# Altium footprint library Misc.PcbLib: 159 footprints (part 6 of 10)
Each footprint in its own frame and in the unit in brackets; x right, y up, seen from the top. Pads: shape width x height; smd on the part's side, far side on the other; paste and mask are expansions set on the pad; w line width, h text height; cw(c..) or ccw(c..) is an arc to the next point about the centre after c.
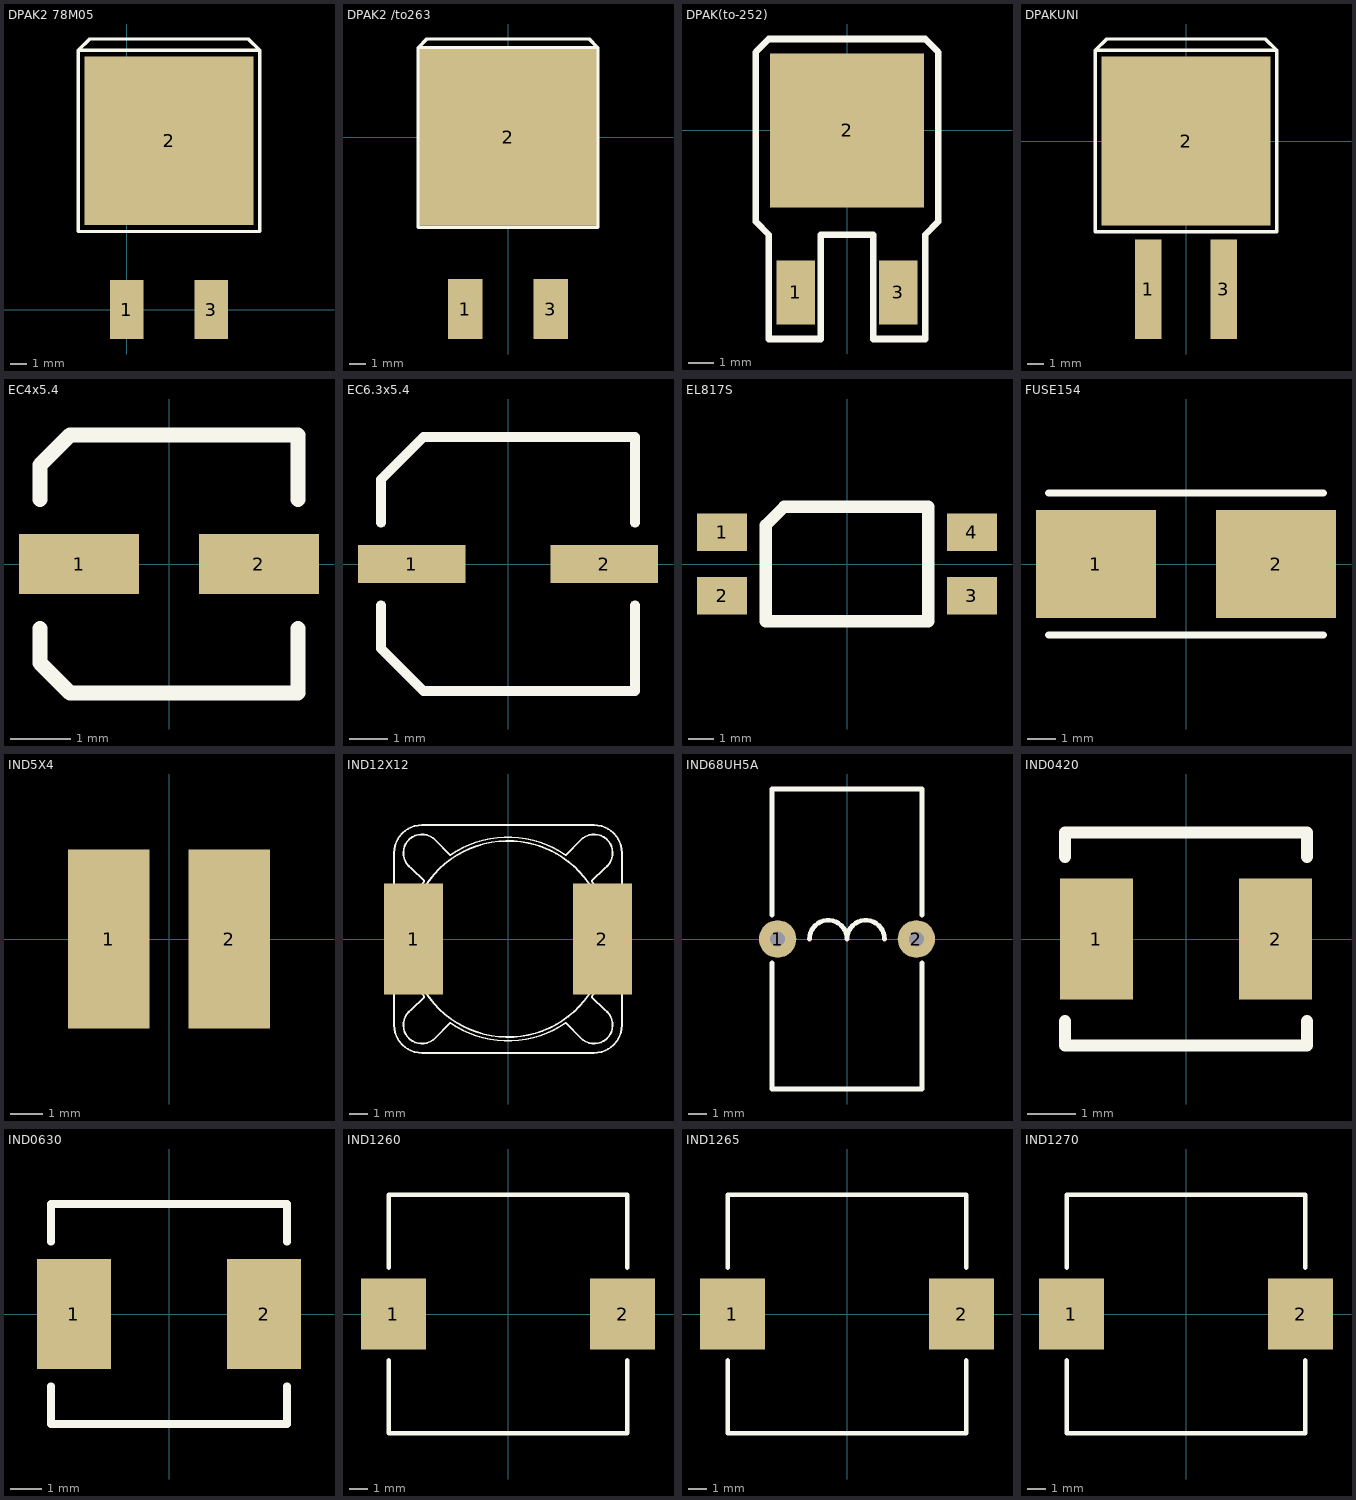
[diagram p5: the footprints below, top view; thin cyan lines are the x and y axes]

## DPAK2 78M05 [mil]
pads (3):
  rect 80x140 smd: 1(0,0) 3(200,0)
  rect 400x400 smd: 2(100,400)
Top Overlay:
  lines w8: -115,615 -88,642 288,642 315,615 ; -115,615 315,615 ; -115,615 -115,185 315,185 315,615
3D body "SW3dPS-DPAK.STEP": height 192.32, standoff -5.24, extent -110,-30.71 290,570.22

## DPAK2 /to263 [mm]
pads (3):
  rect 2.032x3.556 smd: 1(-2.54,-10.2) 3(2.54,-10.2)
  rect 10.49x10.5 smd: 2(0,0)
Top Overlay:
  lines w0.203: -5.334,5.334 -4.826,5.842 4.826,5.842 5.334,5.334 ; -5.334,5.334 -5.334,-5.334 5.334,-5.334 5.334,5.334 ; -5.334,5.334 5.334,5.334

## DPAK(to-252) [mm]
pads (3):
  rect 1.5x2.5 smd: 1(-2,-6.312) 3(2,-6.312)
  rect 6x6 smd: 2(0,0)
Top Overlay:
  lines w0.254: -3.556,-3.556 -3.556,3.048 -3.048,3.556 3.048,3.556 3.556,3.048 3.556,-3.556 3.048,-4.064 3.048,-8.128 1.016,-8.128 1.016,-4.064 -1.016,-4.064 -1.016,-8.128 -3.048,-8.128 -3.048,-4.064 -3.556,-3.556

## DPAKUNI [mm]
pads (3):
  rect 1.6x6 smd: 1(-2.28,-8.93) 3(2.28,-8.93)
  rect 10.16x10.16 smd: 2(0,0)
Top Overlay:
  lines w0.203: -5.461,5.461 -5.461,-5.461 5.461,-5.461 5.461,5.461 ; -5.461,5.461 5.461,5.461 ; -5.461,5.461 -4.775,6.147 4.775,6.147 5.461,5.461
3D body "SW3dPS-DPAK.STEP": height 4.88, standoff -0.13, extent -5.08,-11.188 5.08,4.076

## EC4x5.4 [mm]
height 5.4
pads (2):
  rect 2x1 smd: 1(-1.5,0) 2(1.5,0)
Top Overlay:
  lines w0.254: -2.15,-1.075 -2.15,-1.65 -1.65,-2.15 2.15,-2.15 2.15,-1.075 ; -2.15,1.075 -2.15,1.65 -1.65,2.15 2.15,2.15 2.15,1.075

## EC6.3x5.4 [mm]
height 5.4
pads (2):
  rect 2.8x1 smd: 1(-2.5,0) 2(2.5,0)
Top Overlay:
  lines w0.254: -3.3,-1.075 -3.3,-2.2 -2.2,-3.3 3.3,-3.3 3.3,-1.075 ; -3.3,1.075 -3.3,2.2 -2.2,3.3 3.3,3.3 3.3,1.075

## EL817S [mm]
height 4.3
pads (4):
  rect 2x1.5 smd: 1(-5,1.27) 2(-5,-1.27) 3(5,-1.27) 4(5,1.27)
Top Overlay:
  lines w0.5: -3.25,-2.29 3.25,-2.29 3.25,2.29 -2.51,2.29 -3.25,1.55 -3.25,-2.29
3D body: height 4.3, standoff 0.8, extent -3.25,-2.29 3.25,2.29

## FUSE154 [mm]
height 3.81
pads (2):
  rect 4.24x3.81 smd: 1(-3.185,0) 2(3.185,0)
Top Overlay:
  lines w0.254: -4.865,-2.515 4.865,-2.515 ; -4.865,2.515 4.865,2.515
3D body: height 3.81, standoff 0, extent -4.865,-2.515 4.865,2.515

## IND5X4 [mm]
height 4.5
pads (2):
  rect 2.5x5.5 smd: 1(-1.85,0) 2(1.85,0)
3D body "µç¸Ð.STEP": height 4.5, standoff -0.01, extent -2.857,-2.6 2.857,2.6

## IND12X12 [mm]
pads (2):
  rect 3.2x6 smd: 1(-5.1,0) 2(5.1,0)
Top Overlay:
  circle w0.1: c0,0 r5.3
  lines w0.1: -3.118,-4.533 -3.943,-5.357 cw(c-4.65,-4.65) -5.224,-3.831 -4.532,-3.139 -4.532,-3.117 cw(c0,0) -4.531,3.117 -4.531,3.138 -5.224,3.831 cw(c-4.65,4.65) -3.943,5.357 -3.118,4.533 ; -3.117,-4.531 ccw(c0,0) 3.117,-4.532 3.943,-5.357 ccw(c4.65,-4.65) 5.224,-3.831 4.532,-3.139 4.532,-3.117 ccw(c0,0) 4.531,3.117 4.531,3.138 5.224,3.831 ccw(c4.65,4.65) 3.943,5.357 3.117,4.531 ccw(c0,0) -3.117,4.531 ; -6.15,-4.65 ccw(c-4.65,-4.65) -4.65,-6.15 4.65,-6.15 ccw(c4.65,-4.65) 6.15,-4.65 6.15,4.65 ccw(c4.65,4.65) 4.65,6.15 -4.65,6.15 ccw(c-4.65,4.65) -6.15,4.65 -6.15,-4.65
3D body "User Library-CDRH124_Sumida.step": height 4.6, standoff 0.05, extent -6.15,-6.15 6.15,6.15

## IND68UH5A [mm] "Wire 0.75mm, Core 13mm 50125, Total diameter 15.5mm"
height 16
pads (2):
  round 2 hole 0.8: 1(-3.7,0) 2(3.7,0)
Top Overlay:
  lines w0.254: -4,-1.27 -4,-8 4,-8 4,-1.27 ; -4,1.27 -4,8 4,8 4,1.27 ; -2,0 cw(c-1,0) 0,0 cw(c1,0) 2,0
3D body: height 15.75, standoff 0.25, extent -4,-7.747 4,7.747

## IND0420 [mm] "POWER INDUCTOR"
height 2
pads (2):
  rect 1.5x2.5 smd: 1(-1.85,0) 2(1.85,0)
Top Overlay:
  lines w0.254: -2.5,-1.7 -2.5,-2.2 2.5,-2.2 2.5,-1.7 ; -2.5,1.7 -2.5,2.2 2.5,2.2 2.5,1.7
3D body: height 1.8, standoff 0, extent -2.4,-2.1 2.4,2.1

## IND0630 [mm] "POWER INDUCTOR"
height 3
pads (2):
  rect 2.35x3.5 smd: 1(-3.025,0) 2(3.025,0)
Top Overlay:
  lines w0.254: -3.75,-2.3 -3.75,-3.5 3.75,-3.5 3.75,-2.3 ; -3.75,2.3 -3.75,3.5 3.75,3.5 3.75,2.3
3D body: height 2.8, standoff 0, extent -3.65,-3.4 3.65,3.4

## IND1260 [mm] "POWER INDUCTOR"
height 6
pads (2):
  rect 3.5x3.8 smd: 1(-6.15,0) 2(6.15,0)
Top Overlay:
  lines w0.254: -6.4,-2.5 -6.4,-6.4 6.4,-6.4 6.4,-2.5 ; -6.4,2.5 -6.4,6.4 6.4,6.4 6.4,2.5
3D body: height 6, standoff 0, extent -6.4,-6.4 6.4,6.4

## IND1265 [mm] "POWER INDUCTOR"
height 6.5
pads (2):
  rect 3.5x3.8 smd: 1(-6.15,0) 2(6.15,0)
Top Overlay:
  lines w0.254: -6.4,-2.5 -6.4,-6.4 6.4,-6.4 6.4,-2.5 ; -6.4,2.5 -6.4,6.4 6.4,6.4 6.4,2.5
3D body: height 6.5, standoff 0, extent -6.4,-6.4 6.4,6.4

## IND1270 [mm] "POWER INDUCTOR"
height 7
pads (2):
  rect 3.5x3.8 smd: 1(-6.15,0) 2(6.15,0)
Top Overlay:
  lines w0.254: -6.4,-2.5 -6.4,-6.4 6.4,-6.4 6.4,-2.5 ; -6.4,2.5 -6.4,6.4 6.4,6.4 6.4,2.5
3D body: height 7, standoff 0, extent -6.4,-6.4 6.4,6.4